# Altium footprint library VEGG_PcbLib_ALT.PcbLib: 140 footprints (part 1 of 9)
Each footprint in its own frame and in the unit in brackets; x right, y up, seen from the top. Pads: shape width x height; smd on the part's side, far side on the other; paste and mask are expansions set on the pad; w line width, h text height; cw(c..) or ccw(c..) is an arc to the next point about the centre after c.
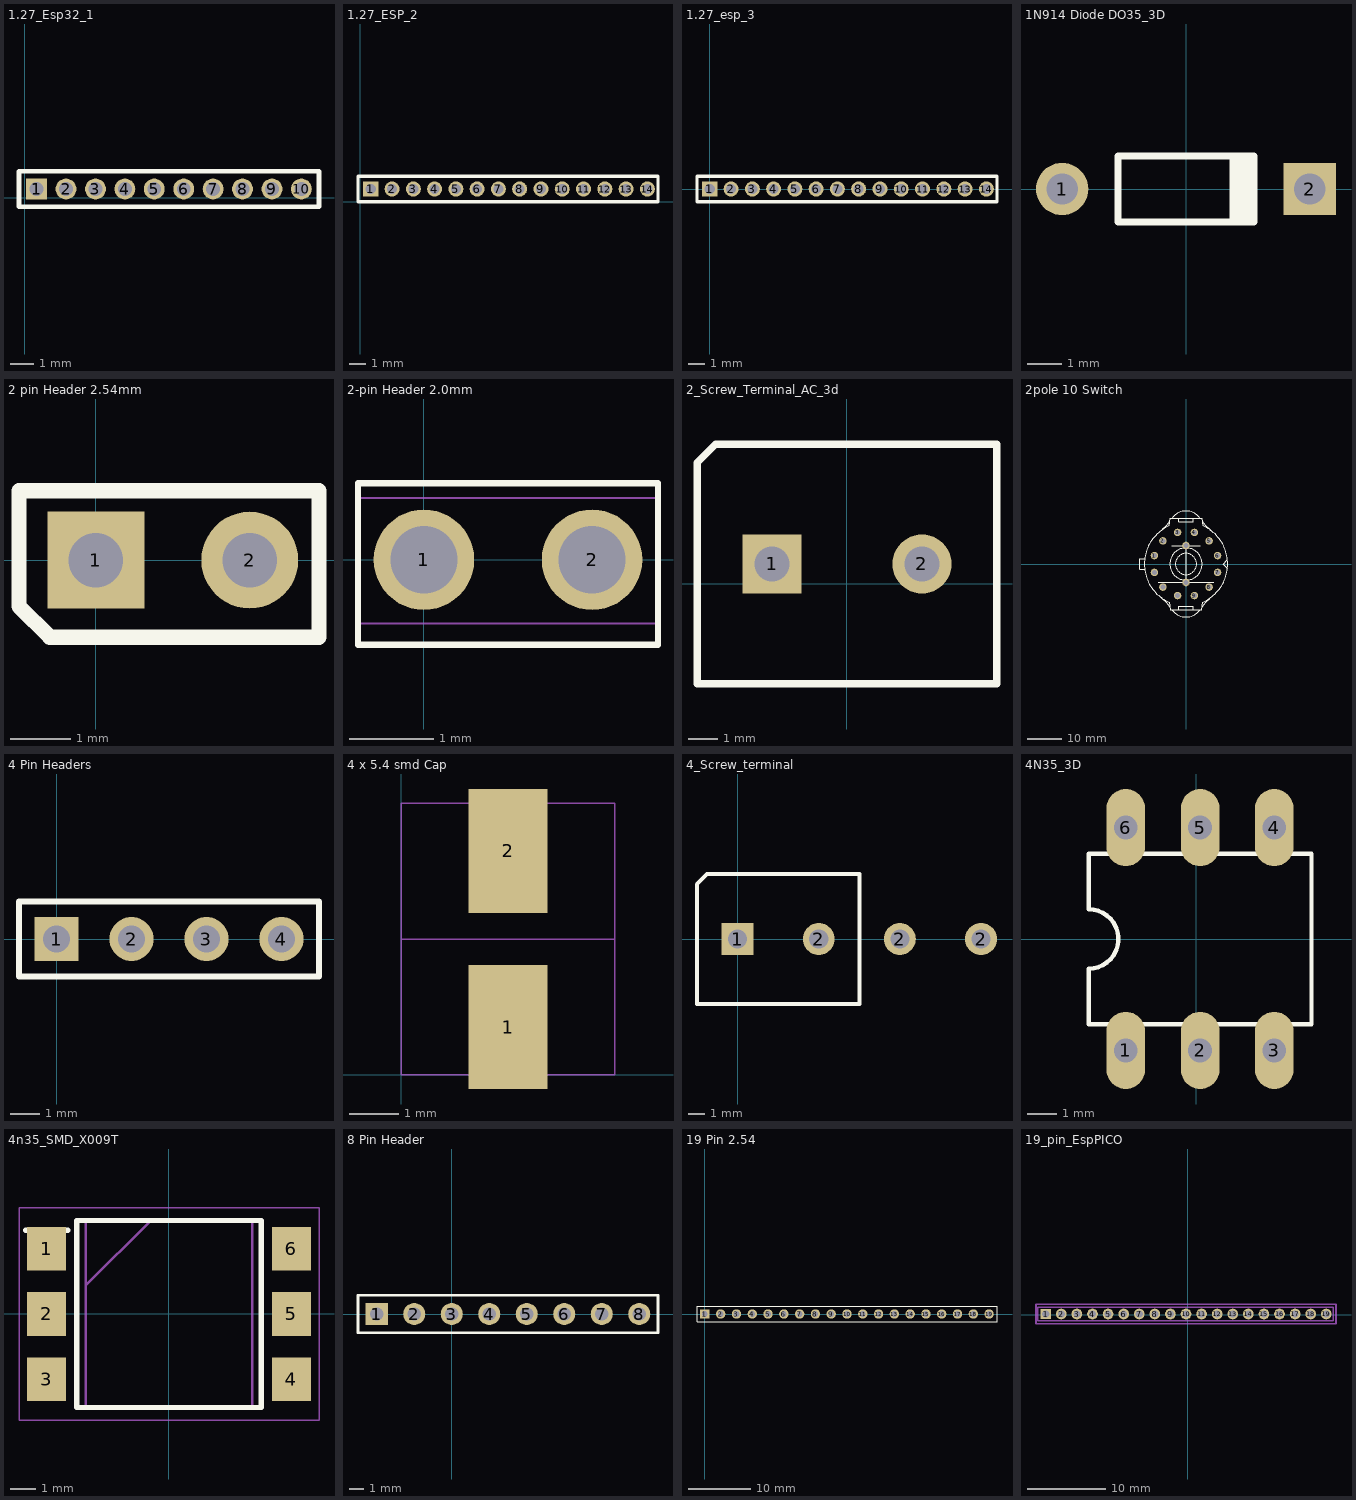
[diagram p0: the footprints below, top view; thin cyan lines are the x and y axes]

## 1.27_Esp32_1 [mm] "10 pin 1.27mm Pitch esp32_1"
pads (10):
  rect 0.9x0.9 hole 0.6: 1(0.508,0.381)
  round 0.9 hole 0.6: 2(1.778,0.381) 3(3.048,0.381) 4(4.318,0.381) 5(5.588,0.381) 6(6.858,0.381) 7(8.128,0.381) 8(9.398,0.381) 9(10.668,0.381) 10(11.938,0.381)
Top Overlay:
  lines w0.2: -0.254,-0.381 12.7,-0.381 12.7,1.143 -0.254,1.143 -0.254,-0.381

## 1.27_ESP_2 [mm] "1.27mm pack, front left 14 pin connector"
pads (14):
  rect 0.9x0.9 hole 0.6: 1(0.635,0.762)
  round 0.9 hole 0.6: 2(1.905,0.762) 3(3.175,0.762) 4(4.445,0.762) 5(5.715,0.762) 6(6.985,0.762) 7(8.255,0.762) 8(9.525,0.762) 9(10.795,0.762) 10(12.065,0.762) 11(13.335,0.762) 12(14.605,0.762) 13(15.875,0.762) 14(17.145,0.762)
Top Overlay:
  lines w0.2: -0.127,0 -0.127,1.524 17.78,1.524 17.78,0 -0.127,0

## 1.27_esp_3 [mm] "front_right esp soc 1.27 pack headers"
pads (14):
  rect 0.9x0.9 hole 0.6: 1(0,0)
  round 0.9 hole 0.6: 2(1.27,0) 3(2.54,0) 4(3.81,0) 5(5.08,0) 6(6.35,0) 7(7.62,0) 8(8.89,0) 9(10.16,0) 10(11.43,0) 11(12.7,0) 12(13.97,0) 13(15.24,0) 14(16.51,0)
Top Overlay:
  lines w0.2: -0.762,-0.762 17.145,-0.762 17.145,0.762 -0.762,0.762 -0.762,-0.762

## 1N914 Diode DO35_3D [mm] "1n914 diode with 3d pac"
pads (2):
  round 1.5 hole 0.9: 1(-3.55,0)
  rect 1.5x1.5 hole 0.9: 2(3.55,0)
Top Overlay:
  rectangle: 1.25,-0.95 2.05,0.95
  lines w0.2: 1.95,-0.95 -1.95,-0.95 -1.95,0.95 1.95,0.95
3D body: height 0.25, standoff 0, extent -0.762,0.127 -0.762,0.127
3D body: height 0.25, standoff 0, extent -0.762,0.127 -0.762,0.127
3D body: height 0.25, standoff 0, extent -4.064,-3.048 -4.064,-3.048
3D body: height 0.25, standoff 0, extent -1.397,0.508 -1.397,0.508
3D body "DO-35_7mm.STEP": height 2.2, standoff -0.7, extent -3.78,-0.925 3.78,0.925

## 2 pin Header 2.54mm [mm]
pads (2):
  rect 1.6x1.6 hole 0.9: 1(0,0)
  round 1.6 hole 0.9: 2(2.54,0)
Top Overlay:
  lines w0.254: -1.27,-0.762 -0.762,-1.27 3.683,-1.27 3.683,1.143 -1.27,1.143 -1.27,-0.762
3D body: height 0.25, standoff 0, extent 0.635,-0.889 0.635,-0.889
3D body "User Library-2PIN.SLDPRT": height 8.1, standoff -2.9, extent -1.27,-1.27 3.81,1.27

## 2-pin Header 2.0mm [mm]
pads (2):
  round 1.2 hole 0.8: 1(0,0) 2(2.007,0)
Top Overlay:
  lines w0.076: -0.787,-1.016 2.794,-1.016 2.794,0.914 -0.787,0.914 -0.787,-1.016
Mechanical 1:
  lines w0.025: -0.787,-0.762 -0.787,0.737 2.794,0.737 2.794,-0.762 -0.787,-0.762

## 2_Screw_Terminal_AC_3d [mm]
pads (2):
  rect 2x2 hole 1.2: 1(-2.538,0.666)
  round 2 hole 1.2: 2(2.542,0.666)
Top Overlay:
  lines w0.254: -5.078,-3.398 5.082,-3.398 5.082,4.73 -4.443,4.73 -5.078,4.095 -5.078,-3.398
3D body: height 0.25, standoff 0, extent 0.002,0.666 0.002,0.666
3D body "Screw Terminal Block 5mm.SLDPRT": height 12.6, standoff -4.3, extent -5.046,-3.793 5.554,5.207

## 2pole 10 Switch [mil]
pads (14):
  round 86 hole 59.06: 1(-361.27,96.8) 2(-264.47,264.47) 3(-96.8,361.27) 4(96.8,361.27) 5(264.47,264.47) 6(361.27,96.8) 7(361.27,-96.8) 8(264.47,-264.47) 9(96.8,-361.27) 10(-96.8,-361.27) 11(-264.47,-264.47) 12(-361.27,-96.8) 13(-1,211) 15(0,-210)
Top Overlay:
  circle w8: c0,0 r121.06
  circle w8: c0,0 r184.06
  lines w1: -316,-210 318,-210 0,-210 ; -162,211 161,211 -1,211 ; 0,-255 0,255.89
  lines w8: -478.35,58.07 -530.51,58.07 -530.51,-58.07 -476.38,-58.07 ; -277.35,-387.99 cw(c-800.75,-949.26) -187.84,-487.4 ; -277.35,387.99 ccw(c-800.75,949.26) -187.84,487.4 ; -194.14,-436.59 cw(c0,-0.55) -194.14,435.48 ; -192.91,436.02 -180.12,524.61 180.12,524.61 191.93,437.99 ; -191.93,-437.99 -180.12,-524.61 180.12,-524.61 192.91,-436.02 ; -155.25,-528.9 ccw(c0,-411.91) 155.25,-528.9 ; -155.25,528.9 cw(c0,411.91) 155.25,528.9 ; -80.71,-520.67 -80.71,-485.24 80.71,-485.24 80.71,-520.67 ; -80.71,520.67 -80.71,485.24 80.71,485.24 80.71,520.67 ; 187.84,-487.4 cw(c800.75,-949.26) 277.35,-387.99 ; 187.84,487.4 ccw(c800.75,949.26) 277.35,387.99 ; 194.14,-435.48 ccw(c0,0.55) 194.14,436.59 ; 473.43,-47.24 426.18,0 473.43,47.24

## 4 Pin Headers [mm] "2.54"
pads (4):
  rect 1.5x1.5 hole 0.9: 1(0,0)
  round 1.5 hole 0.9: 2(2.54,0) 3(5.08,0) 4(7.62,0)
Top Overlay:
  lines w0.2: -1.27,-1.27 8.89,-1.27 8.89,1.27 -1.27,1.27 -1.27,-1.27
3D body "User Library-2PIN.SLDPRT": height 8, standoff -3, extent -1.27,-1.27 3.81,1.27
3D body "User Library-2PIN.SLDPRT": height 8, standoff -3, extent 3.81,-1.27 8.89,1.27

## 4 x 5.4 smd Cap [mm] "SMD_Polar_Cap"
pads (2):
  rect 1.6x2.5 smd: 1(2.159,0.965) 2(2.159,4.521)
Mechanical 4:
  lines w0.025: 0,2.743 4.318,2.743 ; 0,0 4.318,0 4.318,5.486 0,5.486 0,0
3D body "User Library-4x5_4.STEP": height 5.7, standoff 0, extent 0.035,0.068 4.335,5.368

## 4_Screw_terminal [mm]
pads (4):
  rect 2x2 hole 1.2: 1(0,0)
  round 2 hole 1.2: 2(5.08,0) 2(10.16,0) 2(15.24,0)
Top Overlay:
  lines w0.254: -2.54,-4.064 7.62,-4.064 7.62,4.064 -1.905,4.064 -2.54,3.429 -2.54,-4.064
3D body: height 0.25, standoff 0, extent 2.54,0 2.54,0

## 4N35_3D [mil] "4n35 including 3d model"
pads (6):
  oval 52x104 hole 32: 1(-95,-150) 2(5,-150) 3(105,-150) 4(105,150) 5(5,150) 6(-95,150)
Top Overlay:
  lines w6: -145,-115 155,-115 155,115 -145,115 -145,40 cw(c-145,0) -145,-40 -145,-115
3D body "4n35_3d_model.STEP": height 140.46, standoff -161.21, extent -164.28,-155 174.3,145
3D body: height 10, standoff 0, extent 5,0 5,0
3D body: height 10, standoff 0, extent 5,0 5,0
3D body: height 10, standoff 0, extent -295,-50 -295,-50
3D body: height 10, standoff 0, extent -295,-50 -295,-50
3D body: height 10, standoff 0, extent 5,150 5,150
3D body: height 10, standoff 0, extent -315,230 -315,230

## 4n35_SMD_X009T [mm]
pads (6):
  rect 1.52x1.7 smd: 1(-4.775,2.54) 2(-4.775,0) 3(-4.775,-2.54) 4(4.775,-2.54) 5(4.775,0) 6(4.775,2.54)
Top Overlay:
  lines w0.2: -5.6,3.265 -3.95,3.265 ; -3.6,-3.65 -3.6,3.65 3.6,3.65 3.6,-3.65 -3.6,-3.65
Mechanical 15:
  lines w0.1: -3.25,1.11 -0.71,3.65 ; -3.25,-3.65 -3.25,3.65 3.25,3.65 3.25,-3.65 -3.25,-3.65
Mechanical 20:
  lines w0.05: -5.85,-4.15 -5.85,4.15 5.85,4.15 5.85,-4.15 -5.85,-4.15
3D body "4N35-X009T.stp": height 3.8, standoff 0, extent -5.08,-3.65 5.08,3.65

## 8 Pin Header [mm] "2.54mm Pitch"
pads (8):
  rect 1.5x1.5 hole 0.9: 1(-5.08,0)
  round 1.5 hole 0.9: 2(-2.54,0) 3(0,0) 4(2.54,0) 5(5.08,0) 6(7.62,0) 7(10.16,0) 8(12.7,0)
Top Overlay:
  lines w0.2: -6.35,-1.27 -6.35,1.27 13.97,1.27 13.97,-1.27 -6.35,-1.27
3D body "User Library-2PIN.SLDPRT": height 8, standoff -3, extent 8.89,-1.346 13.97,1.194
3D body "User Library-2PIN.SLDPRT": height 8, standoff -3, extent 3.81,-1.346 8.89,1.194
3D body "User Library-2PIN.SLDPRT": height 8, standoff -3, extent -1.27,-1.346 3.81,1.194
3D body "User Library-2PIN.SLDPRT": height 8, standoff -3, extent -6.35,-1.346 -1.27,1.194

## 19 Pin 2.54 [mm]
pads (19):
  rect 1.5x1.5 hole 0.9: 1(0,0)
  round 1.5 hole 0.9: 2(2.54,0) 3(5.08,0) 4(7.62,0) 5(10.16,0) 6(12.7,0) 7(15.24,0) 8(17.78,0) 9(20.32,0) 10(22.86,0) 11(25.4,0) 12(27.94,0) 13(30.48,0) 14(33.02,0) 15(35.56,0) 16(38.1,0) 17(40.64,0) 18(43.18,0) 19(45.72,0)
Top Overlay:
  lines w0.2: 37.465,1.27 37.677,1.27 ; -1.27,-1.27 -1.27,1.27 0.635,1.27 46.99,1.27 46.99,-1.27 -1.27,-1.27
3D body "User Library-2PIN.SLDPRT": height 8, standoff -3, extent -1.295,-1.27 3.785,1.27
3D body "User Library-2PIN.SLDPRT": height 8, standoff -3, extent 3.785,-1.27 8.865,1.27
3D body "User Library-2PIN.SLDPRT": height 8, standoff -3, extent 8.865,-1.27 13.945,1.27
3D body "User Library-2PIN.SLDPRT": height 8, standoff -3, extent 13.945,-1.27 19.025,1.27
3D body "User Library-2PIN.SLDPRT": height 8, standoff -3, extent 19.025,-1.27 24.105,1.27
3D body "User Library-2PIN.SLDPRT": height 8, standoff -3, extent 24.105,-1.27 29.185,1.27
3D body "User Library-2PIN.SLDPRT": height 8, standoff -3, extent 29.185,-1.27 34.265,1.27
3D body "User Library-2PIN.SLDPRT": height 8, standoff -3, extent 34.265,-1.27 39.345,1.27
3D body "User Library-2PIN.SLDPRT": height 8, standoff -3, extent 39.345,-1.27 44.425,1.27
3D body "User Library-2PIN.SLDPRT": height 8, standoff -3, extent 41.885,-1.27 46.965,1.27

## 19_pin_EspPICO [mil]
pads (19):
  rect 52.29x52.29 / inner rect 60x60 / far side rect 52.29x52.29 hole 36: 1(-718.66,5)
  round 54 / inner round 60 / far side round 54 hole 36: 2(-639.92,5) 3(-561.18,5) 4(-482.44,5) 5(-403.7,5) 6(-324.96,5) 7(-246.22,5) 8(-167.48,5) 9(-88.74,5) 10(-10,5) 11(68.74,5) 12(147.48,5) 13(226.22,5) 14(304.96,5) 15(383.7,5) 16(462.44,5) 17(541.18,5) 18(619.92,5) 19(698.66,5)
Mechanical 8:
  region: -649.76,-4.84 -649.76,14.84 -630.08,14.84 -630.08,-4.84
  region: -728.5,-4.84 -728.5,14.84 -708.82,14.84 -708.82,-4.84
  region: -492.28,14.84 -472.6,14.84 -472.6,-4.84 -492.28,-4.84
  region: -571.02,14.84 -551.34,14.84 -551.34,-4.84 -571.02,-4.84
  region: -334.8,14.84 -315.12,14.84 -315.12,-4.84 -334.8,-4.84
  region: -413.54,14.84 -393.86,14.84 -393.86,-4.84 -413.54,-4.84
  region: -177.32,14.84 -157.64,14.84 -157.64,-4.84 -177.32,-4.84
  region: -256.06,14.84 -236.38,14.84 -236.38,-4.84 -256.06,-4.84
  region: -19.84,14.84 -0.16,14.84 -0.16,-4.84 -19.84,-4.84
  region: -98.58,14.84 -78.9,14.84 -78.9,-4.84 -98.58,-4.84
  region: 137.64,14.84 157.32,14.84 157.32,-4.84 137.64,-4.84
  region: 58.9,14.84 78.58,14.84 78.58,-4.84 58.9,-4.84
  region: 295.12,14.84 314.8,14.84 314.8,-4.84 295.12,-4.84
  region: 216.38,14.84 236.06,14.84 236.06,-4.84 216.38,-4.84
  region: 452.6,14.84 472.28,14.84 472.28,-4.84 452.6,-4.84
  region: 373.86,14.84 393.54,14.84 393.54,-4.84 373.86,-4.84
  region: 610.08,14.84 629.76,14.84 629.76,-4.84 610.08,-4.84
  region: 531.34,14.84 551.02,14.84 551.02,-4.84 531.34,-4.84
  region: 688.82,14.84 708.5,14.84 708.5,-4.84 688.82,-4.84
  lines w7.87: -760,-30 735,-30 735,40 -760,40 -760,-30
Mechanical 22:
  lines w8: -767.87,-44.21 747.87,-44.21 747.87,54.21 -767.87,54.21 -767.87,-44.21